# Altium schematic symbol library Semi-ATE.SchLib: 322 symbols (part 5 of 6)
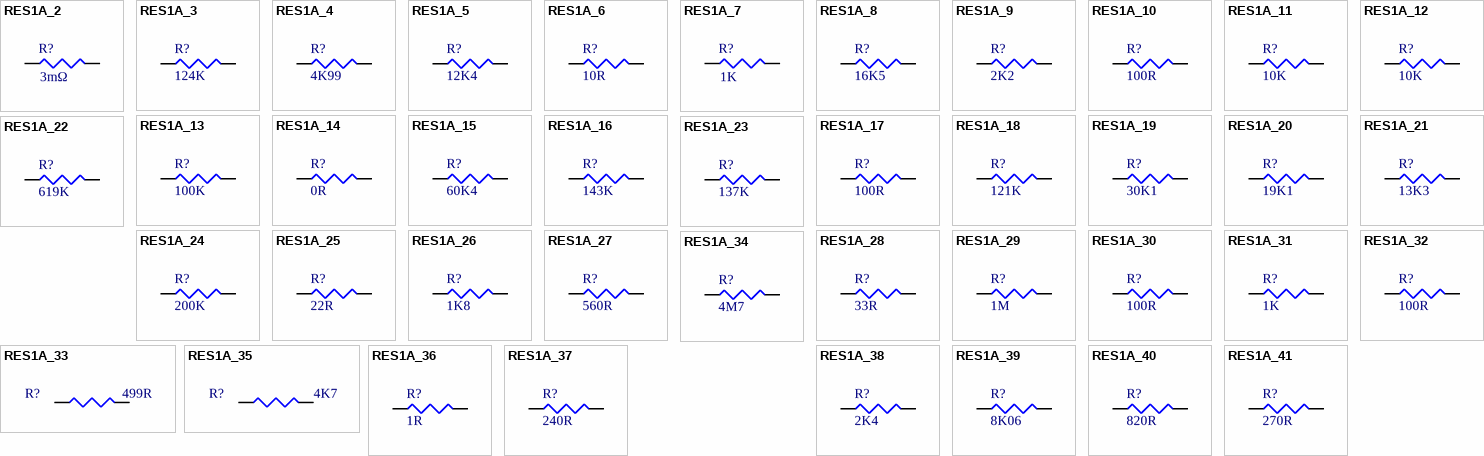
[diagram p23: symbols RES1A_2 to RES1A_41]

## RES1A_6
designator R?, comment value 10R  (hidden comment: R)
RES SMD 10 OHM 1% 1/8W 0805; 04. Manufacturer: Yageo; 07. Manufacturer  Part Number: RC0805FR-0710RL; POPULATED: yes; Parameters: 1/8W, 50V, 1%; 03. Unit Price: 0.09; Voltage Rating: 50V; 3D-Export: No; 01. Distributor: DigiKey; 02. Distributor Part Number: 311-10.0CRDKR-ND; 09. Operating Temperature: -55°C ~ 155°C; 11. RoHS: YES; Temperature Range: -55°C/+125°C; Power Rating: 1/8W; Tolerance: ±1%; Type: Thick Film; ComponentLink4Description: Info; ComponentLink4URL: https://www.digikey.de/product-detail/en/yageo/RC0805FR-0710RL/311-10.0CRDKR-ND/733428; ComponentLink5Description: DataSheet; ComponentLink5URL: http://www.yageo.com/documents/recent/PYu-RC_Group_51_RoHS_L_10.pdf
footprint R0402 (Chip Resistor, Body 1.1x0.5mm (LxW typ), IPC High Density)
footprint R0603 (Chip Resistor, Body 1.6x0.8mm (LxW typ), IPC High Density)
footprint R0805 (Chip Resistor, Body 2.0x1.3mm (LxW typ), IPC High Density)
footprint R1206 (Chip Resistor, Body 3.2x1.6mm (LxW typ), IPC High Density)
footprint R1210 (Chip Resistor, Body 3.2x2.5mm (LxW typ), IPC High Density)
footprint R2010 (Chip Resistor, Body 5.0x2.5mm (LxW typ), IPC High Density)
footprint R2512 (Chip Resistor, Body 6.3x3.2mm (LxW typ), IPC High Density)
footprint R0805 Reflow
pins: 1, 2

## RES1A_7
designator R?, comment value 1K  (hidden comment: R)
RES 1K OHM 1% 1/8W 0805; 04. Manufacturer: Stackpole Electronics Inc; 07. Manufacturer  Part Number: RMCF0805FT1K00; POPULATED: yes; Parameters: 1/8W, 50V, 1%; 03. Unit Price: 0.09; Voltage Rating: 50V; 3D-Export: No; 01. Distributor: DigiKey; 02. Distributor Part Number: RMCF0805FT1K00DKR-ND; 09. Operating Temperature: -55°C ~ 155°C; 11. RoHS: YES; Temperature Range: -55°C/+125°C; Power Rating: 1/8W; Tolerance: ±1%; Type: Thick Film; ComponentLink4Description: Info; ComponentLink4URL: https://www.digikey.de/product-detail/en/stackpole-electronics-inc/RMCF0805FT1K00/RMCF0805FT1K00DKR-ND/1943276; ComponentLink5Description: DataSheet; ComponentLink5URL: https://www.seielect.com/catalog/sei-rmcf_rmcp.pdf
footprint R0402 (Chip Resistor, Body 1.1x0.5mm (LxW typ), IPC High Density)
footprint R0603 (Chip Resistor, Body 1.6x0.8mm (LxW typ), IPC High Density)
footprint R0805 (Chip Resistor, Body 2.0x1.3mm (LxW typ), IPC High Density)
footprint R1206 (Chip Resistor, Body 3.2x1.6mm (LxW typ), IPC High Density)
footprint R1210 (Chip Resistor, Body 3.2x2.5mm (LxW typ), IPC High Density)
footprint R2010 (Chip Resistor, Body 5.0x2.5mm (LxW typ), IPC High Density)
footprint R2512 (Chip Resistor, Body 6.3x3.2mm (LxW typ), IPC High Density)
footprint R0805 Reflow
pins: 1, 2

## RES1A_8
designator R?, comment value 16K5  (hidden comment: R)
RES SMD 16.5K OHM 1% 1/16W 0402; 04. Manufacturer: Yageo; 07. Manufacturer  Part Number: RC0402FR-0716K5L; POPULATED: yes; Parameters: 1/16W, 50V, 1%; 03. Unit Price: 0.09; Voltage Rating: 50V; 3D-Export: No; 01. Distributor: DigiKey; 02. Distributor Part Number: YAG3002DKR-ND; 09. Operating Temperature: -55°C ~ 155°C; 11. RoHS: YES; Temperature Range: -55°C/+125°C; Power Rating: 1/16W; Tolerance: ±1%; Type: Thick Film; ComponentLink4Description: Info; ComponentLink4URL: https://www.digikey.de/product-detail/en/yageo/RC0402FR-0716K5L/YAG3002DKR-ND/5282873
footprint R0402 (Chip Resistor, Body 1.1x0.5mm (LxW typ), IPC High Density)
footprint R0603 (Chip Resistor, Body 1.6x0.8mm (LxW typ), IPC High Density)
footprint R0805 (Chip Resistor, Body 2.0x1.3mm (LxW typ), IPC High Density)
footprint R1206 (Chip Resistor, Body 3.2x1.6mm (LxW typ), IPC High Density)
footprint R1210 (Chip Resistor, Body 3.2x2.5mm (LxW typ), IPC High Density)
footprint R2010 (Chip Resistor, Body 5.0x2.5mm (LxW typ), IPC High Density)
footprint R2512 (Chip Resistor, Body 6.3x3.2mm (LxW typ), IPC High Density)
footprint R0402 Reflow
pins: 1, 2

## RES1A_9
designator R?, comment value 2K2  (hidden comment: R)
RES SMD 2.2K OHM 1% 1/16W 0402; 04. Manufacturer: Yageo; 07. Manufacturer  Part Number: RC0402FR-072K2L; POPULATED: yes; Parameters: 1/16W, 50V, 1%; 03. Unit Price: 0.09; Voltage Rating: 50V; 3D-Export: No; 01. Distributor: DigiKey; 02. Distributor Part Number: 311-2.20KLRDKR-ND; 09. Operating Temperature: -55°C ~ 155°C; 11. RoHS: YES; Temperature Range: -55°C/+125°C; Power Rating: 1/16W; Tolerance: ±1%; Type: Thick Film; ComponentLink4Description: Info; ComponentLink4URL: https://www.digikey.de/product-detail/en/yageo/RC0402FR-072K2L/311-2.20KLRDKR-ND/732447
footprint R0402 (Chip Resistor, Body 1.1x0.5mm (LxW typ), IPC High Density)
footprint R0603 (Chip Resistor, Body 1.6x0.8mm (LxW typ), IPC High Density)
footprint R0805 (Chip Resistor, Body 2.0x1.3mm (LxW typ), IPC High Density)
footprint R1206 (Chip Resistor, Body 3.2x1.6mm (LxW typ), IPC High Density)
footprint R1210 (Chip Resistor, Body 3.2x2.5mm (LxW typ), IPC High Density)
footprint R2010 (Chip Resistor, Body 5.0x2.5mm (LxW typ), IPC High Density)
footprint R2512 (Chip Resistor, Body 6.3x3.2mm (LxW typ), IPC High Density)
footprint R0402 Reflow
pins: 1, 2

## RES1A_10
designator R?, comment value 100R  (hidden comment: R)
RES 100 OHM 1% 1/2W 1206; 04. Manufacturer: Stackpole Electronics Inc; 07. Manufacturer  Part Number: RNCP1206FTD100R; POPULATED: yes; Parameters: 1/4W, 50V, 1%; 03. Unit Price: 0.09; Power Rating: 1/4W; Voltage Rating: 50V; 3D-Export: No; 01. Distributor: DigiKey; 02. Distributor Part Number: RNCP1206FTD100RDKR-ND; 09. Operating Temperature: -55°C ~ 155°C; 11. RoHS: YES; Temperature Range: -55°C/+125°C; Tolerance: ±1%; Type: Thick Film; ComponentLink4Description: Info; ComponentLink4URL: https://www.digikey.de/product-detail/en/stackpole-electronics-inc/RNCP1206FTD100R/RNCP1206FTD100RDKR-ND/2240992; ComponentLink5Description: DataSheet; ComponentLink5URL: https://www.seielect.com/catalog/sei-rncp.pdf
footprint R0402 (Chip Resistor, Body 1.1x0.5mm (LxW typ), IPC High Density)
footprint R0603 (Chip Resistor, Body 1.6x0.8mm (LxW typ), IPC High Density)
footprint R0805 (Chip Resistor, Body 2.0x1.3mm (LxW typ), IPC High Density)
footprint R1206 (Chip Resistor, Body 3.2x1.6mm (LxW typ), IPC High Density)
footprint R1210 (Chip Resistor, Body 3.2x2.5mm (LxW typ), IPC High Density)
footprint R2010 (Chip Resistor, Body 5.0x2.5mm (LxW typ), IPC High Density)
footprint R2512 (Chip Resistor, Body 6.3x3.2mm (LxW typ), IPC High Density)
footprint R1206 Reflow
pins: 1, 2

## RES1A_11
designator R?, comment value 10K  (hidden comment: R)
RES SMD 10K OHM 1% 1/16W 0402; 04. Manufacturer: Yageo; 07. Manufacturer  Part Number: RC0402FR-0710KL; POPULATED: yes; Parameters: 1/16W, 50V, 1%; 03. Unit Price: 0.09; Voltage Rating: 50V; 3D-Export: No; 01. Distributor: DigiKey; 02. Distributor Part Number: 311-10.0KLRDKR-ND; 09. Operating Temperature: -55°C ~ 155°C; 11. RoHS: YES; Temperature Range: -55°C/+125°C; Power Rating: 1/16W; Tolerance: ±1%; Type: Thick Film; ComponentLink4Description: Info; ComponentLink4URL: https://www.digikey.de/product-detail/en/yageo/RC0402FR-0710KL/311-10.0KLRDKR-ND/732417; ComponentLink5Description: DataSheet; ComponentLink5URL: http://www.yageo.com/documents/recent/PYu-RC_Group_51_RoHS_L_10.pdf
footprint R0402 (Chip Resistor, Body 1.1x0.5mm (LxW typ), IPC High Density)
footprint R0603 (Chip Resistor, Body 1.6x0.8mm (LxW typ), IPC High Density)
footprint R0805 (Chip Resistor, Body 2.0x1.3mm (LxW typ), IPC High Density)
footprint R1206 (Chip Resistor, Body 3.2x1.6mm (LxW typ), IPC High Density)
footprint R1210 (Chip Resistor, Body 3.2x2.5mm (LxW typ), IPC High Density)
footprint R2010 (Chip Resistor, Body 5.0x2.5mm (LxW typ), IPC High Density)
footprint R2512 (Chip Resistor, Body 6.3x3.2mm (LxW typ), IPC High Density)
footprint R0402 Reflow
pins: 1, 2

## RES1A_12
designator R?, comment value 10K  (hidden comment: R)
RES SMD 10K OHM 1% 1/10W 0603; 04. Manufacturer: Yageo; 07. Manufacturer  Part Number: RC0603FR-0710KL; POPULATED: yes; Parameters: 1/8W, 50V, 1%; 03. Unit Price: 0.09; Voltage Rating: 50V; 3D-Export: No; 01. Distributor: DigiKey; 02. Distributor Part Number: 311-10.0KHRDKR-ND; 09. Operating Temperature: -55°C ~ 155°C; 11. RoHS: YES; Temperature Range: -55°C/+125°C; Power Rating: 1/10W; Tolerance: ±1%; Type: Thick Film; ComponentLink4Description: Info; ComponentLink4URL: https://www.digikey.de/product-detail/en/yageo/RC0603FR-0710KL/311-10.0KHRDKR-ND/732774; ComponentLink5Description: DataSheet; ComponentLink5URL: http://www.yageo.com/documents/recent/PYu-RC_Group_51_RoHS_L_10.pdf
footprint R0402 (Chip Resistor, Body 1.1x0.5mm (LxW typ), IPC High Density)
footprint R0603 (Chip Resistor, Body 1.6x0.8mm (LxW typ), IPC High Density)
footprint R0805 (Chip Resistor, Body 2.0x1.3mm (LxW typ), IPC High Density)
footprint R1206 (Chip Resistor, Body 3.2x1.6mm (LxW typ), IPC High Density)
footprint R1210 (Chip Resistor, Body 3.2x2.5mm (LxW typ), IPC High Density)
footprint R2010 (Chip Resistor, Body 5.0x2.5mm (LxW typ), IPC High Density)
footprint R2512 (Chip Resistor, Body 6.3x3.2mm (LxW typ), IPC High Density)
footprint R0603 Reflow
pins: 1, 2

## RES1A_13
designator R?, comment value 100K  (hidden comment: R)
RES SMD 100K OHM 1% 1/16W 0402; 04. Manufacturer: Yageo; 07. Manufacturer  Part Number: RC0402FR-07100KL; POPULATED: yes; Parameters: 1/16W, 50V, 1%; 03. Unit Price: 0.09; Voltage Rating: 50V; 3D-Export: No; 01. Distributor: DigiKey; 02. Distributor Part Number: 311-100KLRDKR-ND; 09. Operating Temperature: -55°C ~ 155°C; 11. RoHS: YES; Temperature Range: -55°C/+125°C; Power Rating: 1/16W; Tolerance: ±1%; Type: Thick Film; ComponentLink4Description: Info; ComponentLink4URL: https://www.digikey.de/product-detail/en/yageo/RC0402FR-07100KL/311-100KLRDKR-ND/732420; ComponentLink5Description: DataSheet; ComponentLink5URL: http://www.yageo.com/documents/recent/PYu-RC_Group_51_RoHS_L_10.pdf
footprint R0402 (Chip Resistor, Body 1.1x0.5mm (LxW typ), IPC High Density)
footprint R0603 (Chip Resistor, Body 1.6x0.8mm (LxW typ), IPC High Density)
footprint R0805 (Chip Resistor, Body 2.0x1.3mm (LxW typ), IPC High Density)
footprint R1206 (Chip Resistor, Body 3.2x1.6mm (LxW typ), IPC High Density)
footprint R1210 (Chip Resistor, Body 3.2x2.5mm (LxW typ), IPC High Density)
footprint R2010 (Chip Resistor, Body 5.0x2.5mm (LxW typ), IPC High Density)
footprint R2512 (Chip Resistor, Body 6.3x3.2mm (LxW typ), IPC High Density)
footprint R0402 Reflow
pins: 1, 2

## RES1A_14
designator R?, comment value 0R  (hidden comment: R)
RES SMD 0 OHM JUMPER 1/16W 0402; 04. Manufacturer: Yageo; 07. Manufacturer  Part Number: RC0402JR-070RL; POPULATED: yes; Parameters: 1A; 03. Unit Price: 0.09; Power Rating: N.A.; Tolerance: ±1%; 3D-Export: No; 01. Distributor: DigiKey; 02. Distributor Part Number: 311-0.0JRDKR-ND; 09. Operating Temperature: -55°C ~ 155°C; 11. RoHS: YES; Temperature Range: -55°C/+125°C; Type: Thick Film; Voltage Rating: N.A.; ComponentLink4Description: Info; ComponentLink4URL: https://www.digikey.de/product-detail/en/yageo/RC0402JR-070RL/311-0.0JRDKR-ND/732300; ComponentLink5Description: DataSheet; ComponentLink5URL: http://www.yageo.com/documents/recent/PYu-RC_Group_51_RoHS_L_10.pdf
footprint R0402 (Chip Resistor, Body 1.1x0.5mm (LxW typ), IPC High Density)
footprint R0603 (Chip Resistor, Body 1.6x0.8mm (LxW typ), IPC High Density)
footprint R0805 (Chip Resistor, Body 2.0x1.3mm (LxW typ), IPC High Density)
footprint R1206 (Chip Resistor, Body 3.2x1.6mm (LxW typ), IPC High Density)
footprint R1210 (Chip Resistor, Body 3.2x2.5mm (LxW typ), IPC High Density)
footprint R2010 (Chip Resistor, Body 5.0x2.5mm (LxW typ), IPC High Density)
footprint R2512 (Chip Resistor, Body 6.3x3.2mm (LxW typ), IPC High Density)
footprint R0402 Reflow
pins: 1, 2

## RES1A_15
designator R?, comment value 60K4  (hidden comment: R)
RES SMD 60.4K OHM 1% 1/16W 0402; 04. Manufacturer: Yageo; 07. Manufacturer  Part Number: RC0402FR-0760K4L; POPULATED: yes; Parameters: 1/16W, 50V, 1%; 03. Unit Price: 0.09; Voltage Rating: 50V; 3D-Export: No; Temperature Range: -55°C/+125°C; 01. Distributor: DigiKey; 02. Distributor Part Number: 311-60.4KLRDKR-ND; 09. Operating Temperature: -55°C ~ 155°C; 11. RoHS: YES; Power Rating: 1/16W; Tolerance: ±1%; Type: Thick Film; ComponentLink4Description: Info; ComponentLink4URL: https://www.digikey.de/product-detail/en/yageo/RC0402FR-0760K4L/311-60.4KLRDKR-ND/732537; ComponentLink5Description: DataSheet; ComponentLink5URL: http://www.yageo.com/documents/recent/PYu-RC_Group_51_RoHS_L_10.pdf
footprint R0603 (Chip Resistor, Body 1.6x0.8mm (LxW typ), IPC High Density)
footprint R0402
footprint R0402 Reflow
pins: 1, 2

## RES1A_16
designator R?, comment value 143K  (hidden comment: R)
RES SMD 143K OHM 1% 1/16W 0402; 04. Manufacturer: Yageo; 07. Manufacturer  Part Number: RC0402FR-07143KL; POPULATED: yes; Parameters: 1/16W, 50V, 1%; 03. Unit Price: 0.09; Voltage Rating: 50V; 3D-Export: No; Temperature Range: -55°C/+125°C; 01. Distributor: DigiKey; 02. Distributor Part Number: YAG2979CT-ND; 09. Operating Temperature: -55°C ~ 155°C; 11. RoHS: YES; Power Rating: 1/16W; Tolerance: ±1%; Type: Thick Film; ComponentLink4Description: Info; ComponentLink4URL: https://www.digikey.de/products/en?keywords=YAG2979CT-ND; ComponentLink5Description: DataSheet; ComponentLink5URL: http://www.yageo.com/documents/recent/PYu-RC_Group_51_RoHS_L_10.pdf
footprint R0603 (Chip Resistor, Body 1.6x0.8mm (LxW typ), IPC High Density)
footprint R0402
footprint R0402 Reflow
pins: 1, 2

## RES1A_17
designator R?, comment value 100R  (hidden comment: R)
RES SMD 100 OHM 1% 1/16W 0402; 04. Manufacturer: Yageo; 07. Manufacturer  Part Number: RC0402FR-07100RL; POPULATED: yes; Parameters: 1/16W, 50V, 1%; 03. Unit Price: 0.09; Voltage Rating: 50V; 3D-Export: No; Temperature Range: -55°C/+125°C; 01. Distributor: DigiKey; 02. Distributor Part Number: 311-100LRDKR-ND; 09. Operating Temperature: -55°C ~ 155°C; 11. RoHS: YES; Power Rating: 1/16W; Tolerance: ±1%; Type: Thick Film; ComponentLink4Description: Info; ComponentLink4URL: https://www.digikey.de/product-detail/en/yageo/RC0402FR-07100RL/311-100LRDKR-ND/732421; ComponentLink5Description: DataSheet; ComponentLink5URL: http://www.yageo.com/documents/recent/PYu-RC_Group_51_RoHS_L_10.pdf
footprint R0603 (Chip Resistor, Body 1.6x0.8mm (LxW typ), IPC High Density)
footprint R0402
footprint R1206 (Chip Resistor, Body 3.2x1.6mm (LxW typ), IPC High Density)
footprint R0402 Reflow
pins: 1, 2

## RES1A_18
designator R?, comment value 121K  (hidden comment: R)
RES SMD 10K OHM 1% 1/16W 0402; 04. Manufacturer: Yageo; 07. Manufacturer  Part Number: RC0402FR-07121KL; POPULATED: yes; Parameters: 1/16W, 50V, 1%; 03. Unit Price: 0.09; Voltage Rating: 50V; 3D-Export: No; Temperature Range: -55°C/+125°C; 01. Distributor: DigiKey; 02. Distributor Part Number: 311-121KLRCT-ND; 09. Operating Temperature: -55°C ~ 155°C; 11. RoHS: YES; Power Rating: 1/16W; Tolerance: ±1%; Type: Thick Film; ComponentLink4Description: Info; ComponentLink4URL: https://www.digikey.de/products/en?keywords=311-121KLRCT-ND; ComponentLink5Description: DataSheet; ComponentLink5URL: http://www.yageo.com/documents/recent/PYu-RC_Group_51_RoHS_L_10.pdf
footprint R0402 (Chip Resistor, Body 1.1x0.5mm (LxW typ), IPC High Density)
footprint R0603 (Chip Resistor, Body 1.6x0.8mm (LxW typ), IPC High Density)
footprint R0805 (Chip Resistor, Body 2.0x1.3mm (LxW typ), IPC High Density)
footprint R1206 (Chip Resistor, Body 3.2x1.6mm (LxW typ), IPC High Density)
footprint R1210 (Chip Resistor, Body 3.2x2.5mm (LxW typ), IPC High Density)
footprint R2010 (Chip Resistor, Body 5.0x2.5mm (LxW typ), IPC High Density)
footprint R2512 (Chip Resistor, Body 6.3x3.2mm (LxW typ), IPC High Density)
footprint R0402 Reflow
pins: 1, 2

## RES1A_19
designator R?, comment value 30K1  (hidden comment: R)
RES SMD 30.1K OHM 1% 1/16W 0402; 04. Manufacturer: Yageo; 07. Manufacturer  Part Number: RC0402FR-0730K1L; POPULATED: yes; Parameters: 1/16W, 50V, 1%; 03. Unit Price: 0.09; Voltage Rating: 50V; 3D-Export: No; Temperature Range: -55°C/+125°C; 01. Distributor: DigiKey; 02. Distributor Part Number: 311-30.1KLRCT-ND; 09. Operating Temperature: -55°C ~ 155°C; 11. RoHS: YES; Power Rating: 1/16W; Tolerance: ±1%; Type: Thick Film; ComponentLink4Description: Info; ComponentLink4URL: https://www.digikey.de/products/en?keywords=311-30.1KLRCT-ND; ComponentLink5Description: DataSheet; ComponentLink5URL: http://www.yageo.com/documents/recent/PYu-RC_Group_51_RoHS_L_10.pdf
footprint R0402 (Chip Resistor, Body 1.1x0.5mm (LxW typ), IPC High Density)
footprint R0603 (Chip Resistor, Body 1.6x0.8mm (LxW typ), IPC High Density)
footprint R0805 (Chip Resistor, Body 2.0x1.3mm (LxW typ), IPC High Density)
footprint R1206 (Chip Resistor, Body 3.2x1.6mm (LxW typ), IPC High Density)
footprint R1210 (Chip Resistor, Body 3.2x2.5mm (LxW typ), IPC High Density)
footprint R2010 (Chip Resistor, Body 5.0x2.5mm (LxW typ), IPC High Density)
footprint R2512 (Chip Resistor, Body 6.3x3.2mm (LxW typ), IPC High Density)
footprint R0402 Reflow
pins: 1, 2

## RES1A_20
designator R?, comment value 19K1  (hidden comment: R)
RES SMD 19.1K OHM 1% 1/16W 0402; 04. Manufacturer: Yageo; 07. Manufacturer  Part Number: RC0402FR-0719K1L; POPULATED: yes; Parameters: 1/16W, 50V, 1%; 03. Unit Price: 0.09; Voltage Rating: 50V; 3D-Export: No; Temperature Range: -55°C/+125°C; 01. Distributor: DigiKey; 02. Distributor Part Number: 311-19.1KLRCT-ND; 09. Operating Temperature: -55°C ~ 155°C; 11. RoHS: YES; Power Rating: 1/16W; Tolerance: ±1%; Type: Thick Film; ComponentLink4Description: Info; ComponentLink4URL: https://www.digikey.de/products/en?keywords=311-19.1KLRCT-ND; ComponentLink5Description: DataSheet; ComponentLink5URL: http://www.yageo.com/documents/recent/PYu-RC_Group_51_RoHS_L_10.pdf
footprint R0402 (Chip Resistor, Body 1.1x0.5mm (LxW typ), IPC High Density)
footprint R0603 (Chip Resistor, Body 1.6x0.8mm (LxW typ), IPC High Density)
footprint R0805 (Chip Resistor, Body 2.0x1.3mm (LxW typ), IPC High Density)
footprint R1206 (Chip Resistor, Body 3.2x1.6mm (LxW typ), IPC High Density)
footprint R1210 (Chip Resistor, Body 3.2x2.5mm (LxW typ), IPC High Density)
footprint R2010 (Chip Resistor, Body 5.0x2.5mm (LxW typ), IPC High Density)
footprint R2512 (Chip Resistor, Body 6.3x3.2mm (LxW typ), IPC High Density)
footprint R0402 Reflow
pins: 1, 2

## RES1A_21
designator R?, comment value 13K3  (hidden comment: R)
RES SMD 13.3K OHM 1% 1/16W 0402; 04. Manufacturer: Yageo; 07. Manufacturer  Part Number: RC0402FR-0713K3L; POPULATED: yes; Parameters: 1/16W, 50V, 1%; 03. Unit Price: 0.09; Voltage Rating: 50V; 3D-Export: No; Temperature Range: -55°C/+125°C; 01. Distributor: DigiKey; 02. Distributor Part Number: YAG2974CT-ND; 09. Operating Temperature: -55°C ~ 155°C; 11. RoHS: YES; Power Rating: 1/16W; Tolerance: ±1%; Type: Thick Film; ComponentLink4Description: Info; ComponentLink4URL: https://www.digikey.de/products/en?keywords=YAG2974CT-ND; ComponentLink5Description: DataSheet; ComponentLink5URL: http://www.yageo.com/documents/recent/PYu-RC_Group_51_RoHS_L_10.pdf
footprint R0402 (Chip Resistor, Body 1.1x0.5mm (LxW typ), IPC High Density)
footprint R0603 (Chip Resistor, Body 1.6x0.8mm (LxW typ), IPC High Density)
footprint R0805 (Chip Resistor, Body 2.0x1.3mm (LxW typ), IPC High Density)
footprint R1206 (Chip Resistor, Body 3.2x1.6mm (LxW typ), IPC High Density)
footprint R1210 (Chip Resistor, Body 3.2x2.5mm (LxW typ), IPC High Density)
footprint R2010 (Chip Resistor, Body 5.0x2.5mm (LxW typ), IPC High Density)
footprint R2512 (Chip Resistor, Body 6.3x3.2mm (LxW typ), IPC High Density)
footprint R0402 Reflow
pins: 1, 2

## RES1A_22
designator R?, comment value 619K  (hidden comment: R)
RES SMD 619K OHM 1% 1/16W 0402; 04. Manufacturer: Yageo; 07. Manufacturer  Part Number: AC0402FR-07619KL; Parameters: 1/16W, 50V, 1%; POPULATED: yes; 03. Unit Price: 0.09; Voltage Rating: 50V; 3D-Export: No; 01. Distributor: DigiKey; 02. Distributor Part Number: YAG5679DKR-ND; 09. Operating Temperature: -55°C ~ 155°C; 11. RoHS: YES; Temperature Range: -55°C/+125°C; Power Rating: 1/16W; Tolerance: ±1%; Type: Thick Film; ComponentLink4Description: Info; ComponentLink4URL: https://www.digikey.de/product-detail/en/yageo/RC0402FR-07453KL/YAG3164DKR-ND/5283035; ComponentLink5Description: DataSheet; ComponentLink5URL: http://www.yageo.com/documents/recent/PYu-RC_Group_51_RoHS_L_10.pdf
footprint R0603 (Chip Resistor, Body 1.6x0.8mm (LxW typ), IPC High Density)
footprint R0402
footprint R0402 Reflow
pins: 1, 2

## RES1A_23
designator R?, comment value 137K  (hidden comment: R)
RES SMD 137K OHM 1% 1/16W 0402; 04. Manufacturer: Yageo; 07. Manufacturer  Part Number: RC0402FR-07137KL; Parameters: 1/16W, 50V, 1%; POPULATED: yes; 03. Unit Price: 0.09; Voltage Rating: 50V; 3D-Export: No; 01. Distributor: DigiKey; 02. Distributor Part Number: YAG2972DKR-ND; 09. Operating Temperature: -55°C ~ 155°C; 11. RoHS: YES; Temperature Range: -55°C/+125°C; Power Rating: 1/16W; Tolerance: ±1%; Type: Thick Film; ComponentLink4Description: Info; ComponentLink4URL: https://www.digikey.de/product-detail/en/yageo/RC0402FR-07100KL/311-100KLRDKR-ND/732420; ComponentLink5Description: DataSheet; ComponentLink5URL: http://www.yageo.com/documents/recent/PYu-RC_Group_51_RoHS_L_10.pdf
footprint R0603 (Chip Resistor, Body 1.6x0.8mm (LxW typ), IPC High Density)
footprint R0402
footprint R0402 Reflow
pins: 1, 2

## RES1A_24
designator R?, comment value 200K  (hidden comment: R)
RES SMD 200K OHM 1% 1/16W 0402; 04. Manufacturer: Yageo; 07. Manufacturer  Part Number: RC0402FR-07200KL; POPULATED: yes; Parameters: 1/16W, 50V, 1%; 03. Unit Price: 0.09; Voltage Rating: 50V; 3D-Export: No; 01. Distributor: DigiKey; 02. Distributor Part Number: 311-200KLRDKR-ND; 09. Operating Temperature: -55°C ~ 155°C; 11. RoHS: YES; Temperature Range: -55°C/+125°C; Power Rating: 1/16W; Tolerance: ±1%; Type: Thick Film; ComponentLink4Description: Info; ComponentLink4URL: https://www.digikey.de/product-detail/en/yageo/RC0402FR-07200KL/311-200KLRDKR-ND/732452
footprint R0402 (Chip Resistor, Body 1.1x0.5mm (LxW typ), IPC High Density)
footprint R0603 (Chip Resistor, Body 1.6x0.8mm (LxW typ), IPC High Density)
footprint R0805 (Chip Resistor, Body 2.0x1.3mm (LxW typ), IPC High Density)
footprint R1206 (Chip Resistor, Body 3.2x1.6mm (LxW typ), IPC High Density)
footprint R1210 (Chip Resistor, Body 3.2x2.5mm (LxW typ), IPC High Density)
footprint R2010 (Chip Resistor, Body 5.0x2.5mm (LxW typ), IPC High Density)
footprint R2512 (Chip Resistor, Body 6.3x3.2mm (LxW typ), IPC High Density)
footprint R0402 Reflow
pins: 1, 2

## RES1A_25
designator R?, comment value 22R  (hidden comment: R)
RES SMD 22 OHM 1% 1/16W 0402; 04. Manufacturer: Yageo; 07. Manufacturer  Part Number: RC0402FR-0722RL; POPULATED: yes; Parameters: 1/16W, 50V, 1%; 03. Unit Price: 0.09; Voltage Rating: 50V; 3D-Export: No; Temperature Range: -55°C/+125°C; 01. Distributor: DigiKey; 02. Distributor Part Number: 311-22.0LRDKR-ND; 09. Operating Temperature: -55°C ~ 155°C; 11. RoHS: YES; Power Rating: 1/16W; Tolerance: ±1%; Type: Thick Film; ComponentLink4Description: Info; ComponentLink4URL: https://www.digikey.de/product-detail/en/yageo/RC0402FR-0722RL/311-22.0LRDKR-ND/732456; ComponentLink5Description: DataSheet; ComponentLink5URL: http://www.yageo.com/documents/recent/PYu-RC_Group_51_RoHS_L_10.pdf
footprint R0402 (Chip Resistor, Body 1.1x0.5mm (LxW typ), IPC High Density)
footprint R0603 (Chip Resistor, Body 1.6x0.8mm (LxW typ), IPC High Density)
footprint R0805 (Chip Resistor, Body 2.0x1.3mm (LxW typ), IPC High Density)
footprint R1206 (Chip Resistor, Body 3.2x1.6mm (LxW typ), IPC High Density)
footprint R1210 (Chip Resistor, Body 3.2x2.5mm (LxW typ), IPC High Density)
footprint R2010 (Chip Resistor, Body 5.0x2.5mm (LxW typ), IPC High Density)
footprint R2512 (Chip Resistor, Body 6.3x3.2mm (LxW typ), IPC High Density)
footprint R0402 Reflow
pins: 1, 2

## RES1A_26
designator R?, comment value 1K8  (hidden comment: R)
RES SMD 1.8K OHM 1% 1/16W 0402; 04. Manufacturer: Yageo; 07. Manufacturer  Part Number: RC0402FR-071K8L; Parameters: 1/16W, 50V, 1%; POPULATED: yes; 03. Unit Price: 0.09; Voltage Rating: 50V; 3D-Export: No; Temperature Range: -55°C/+125°C; 01. Distributor: DigiKey; 02. Distributor Part Number: 311-1.80KLRDKR-ND; 09. Operating Temperature: -55°C ~ 155°C; 11. RoHS: YES; Power Rating: 1/16W; Tolerance: ±1%; Type: Thick Film; ComponentLink4Description: Info; ComponentLink4URL: https://www.digikey.de/product-detail/en/yageo/RC0402FR-071K8L/311-1.80KLRDKR-ND/732414; ComponentLink5Description: DataSheet; ComponentLink5URL: http://www.yageo.com/documents/recent/PYu-RC_Group_51_RoHS_L_10.pdf
footprint R0402 (Chip Resistor, Body 1.1x0.5mm (LxW typ), IPC High Density)
footprint R0603 (Chip Resistor, Body 1.6x0.8mm (LxW typ), IPC High Density)
footprint R0805 (Chip Resistor, Body 2.0x1.3mm (LxW typ), IPC High Density)
footprint R1206 (Chip Resistor, Body 3.2x1.6mm (LxW typ), IPC High Density)
footprint R1210 (Chip Resistor, Body 3.2x2.5mm (LxW typ), IPC High Density)
footprint R2010 (Chip Resistor, Body 5.0x2.5mm (LxW typ), IPC High Density)
footprint R2512 (Chip Resistor, Body 6.3x3.2mm (LxW typ), IPC High Density)
footprint R0402 Reflow
pins: 1, 2

## RES1A_27
designator R?, comment value 560R  (hidden comment: R)
RES SMD 560 OHM 1% 1/16W 0402; 04. Manufacturer: Yageo; 07. Manufacturer  Part Number: RC0402FR-07560RL; POPULATED: yes; Parameters: 1/16W, 50V, 1%; 03. Unit Price: 0.09; Voltage Rating: 50V; 3D-Export: No; Temperature Range: -55°C/+125°C; 01. Distributor: DigiKey; 02. Distributor Part Number: 311-560LRDKR-ND; 09. Operating Temperature: -55°C ~ 155°C; 11. RoHS: YES; Power Rating: 1/16W; Tolerance: ±1%; Type: Thick Film; ComponentLink4Description: Info; ComponentLink4URL: https://www.digikey.de/product-detail/en/yageo/RC0402FR-07560RL/311-560LRDKR-ND/732532; ComponentLink5Description: DataSheet; ComponentLink5URL: http://www.yageo.com/documents/recent/PYu-RC_Group_51_RoHS_L_10.pdf
footprint R0402 (Chip Resistor, Body 1.1x0.5mm (LxW typ), IPC High Density)
footprint R0603 (Chip Resistor, Body 1.6x0.8mm (LxW typ), IPC High Density)
footprint R0805 (Chip Resistor, Body 2.0x1.3mm (LxW typ), IPC High Density)
footprint R1206 (Chip Resistor, Body 3.2x1.6mm (LxW typ), IPC High Density)
footprint R1210 (Chip Resistor, Body 3.2x2.5mm (LxW typ), IPC High Density)
footprint R2010 (Chip Resistor, Body 5.0x2.5mm (LxW typ), IPC High Density)
footprint R2512 (Chip Resistor, Body 6.3x3.2mm (LxW typ), IPC High Density)
footprint R0402 Reflow
pins: 1, 2

## RES1A_28
designator R?, comment value 33R  (hidden comment: R)
RES SMD 33 OHM 1% 1/16W 0402; 04. Manufacturer: Yageo; 07. Manufacturer  Part Number: RC0402FR-0733RL; POPULATED: yes; Parameters: 1/16W, 50V, 1%; 03. Unit Price: 0.09; Voltage Rating: 50V; 3D-Export: No; Temperature Range: -55°C/+125°C; 01. Distributor: DigiKey; 02. Distributor Part Number: 311-33.0LRDKR-ND; 09. Operating Temperature: -55°C ~ 155°C; 11. RoHS: YES; Power Rating: 1/16W; Tolerance: ±1%; Type: Thick Film; ComponentLink4Description: Info; ComponentLink4URL: https://www.digikey.de/product-detail/en/yageo/RC0402FR-0733RL/311-33.0LRDKR-ND/732487; ComponentLink5Description: DataSheet; ComponentLink5URL: http://www.yageo.com/documents/recent/PYu-RC_Group_51_RoHS_L_10.pdf
footprint R0402 (Chip Resistor, Body 1.1x0.5mm (LxW typ), IPC High Density)
footprint R0402 (Chip Resistor, Body 1.1x0.5mm (LxW typ), IPC High Density)
footprint R0805 (Chip Resistor, Body 2.0x1.3mm (LxW typ), IPC High Density)
footprint R1206 (Chip Resistor, Body 3.2x1.6mm (LxW typ), IPC High Density)
footprint R1210 (Chip Resistor, Body 3.2x2.5mm (LxW typ), IPC High Density)
footprint R2010 (Chip Resistor, Body 5.0x2.5mm (LxW typ), IPC High Density)
footprint R2512 (Chip Resistor, Body 6.3x3.2mm (LxW typ), IPC High Density)
footprint R0402 Reflow
pins: 1, 2

## RES1A_29
designator R?, comment value 1M  (hidden comment: R)
RES SMD 1M OHM 1% 1/10W 0402; 04. Manufacturer: Panasonic Electronic Components; 07. Manufacturer  Part Number: ERJ-2RKF1004X; Parameters: 1/10W, 50V, 1%; POPULATED: yes; 03. Unit Price: 0.09; Voltage Rating: 50V; 3D-Export: No; Temperature Range: -55°C/+125°C; 01. Distributor: DigiKey; 02. Distributor Part Number: P1.00MLDKR-ND; 09. Operating Temperature: -55°C ~ 155°C; 11. RoHS: YES; Power Rating: 1/10W; Tolerance: ±1%; Type: Thick Film; ComponentLink4Description: Info; ComponentLink4URL: https://www.digikey.de/product-detail/en/panasonic-electronic-components/ERJ-2RKF1004X/P1.00MLDKR-ND/575436; ComponentLink5Description: DataSheet; ComponentLink5URL: https://industrial.panasonic.com/cdbs/www-data/pdf/RDA0000/AOA0000C304.pdf
footprint 0402
footprint R0402
footprint R0603
footprint R0402 Reflow
pins: 1, 2

## RES1A_30
designator R?, comment value 100R  (hidden comment: R)
RES SMD 100 OHM 1% 1/16W 0603; 04. Manufacturer: TE Connectivity Passive Product; 07. Manufacturer  Part Number: CPF0603F100RC1; POPULATED: yes; Parameters: 1/16W, 50V, 1%; 03. Unit Price: 0.14; Voltage Rating: 50V; 3D-Export: No; Temperature Range: -55°C/+125°C; 01. Distributor: DigiKey; 02. Distributor Part Number: A102200DKR-ND; 09. Operating Temperature: -55°C ~ 155°C; 11. RoHS: YES; Power Rating: 1/16W; Tolerance: ±1%; Type: Thick Film; ComponentLink4Description: Info; ComponentLink4URL: https://www.digikey.de/products/en/resistors/chip-resistor-surface-mount/52?k=&pkeyword=&sv=0&pv7=243&sf=1&FV=c0001%2C400005%2C1f140000%2Cmu100+Ohms%7C2085%2Cffe00034%2C80001&quantity=&ColumnSort=0&page=1&pageSize=25; ComponentLink5Description: DataSheet; ComponentLink5URL: https://www.te.com/commerce/DocumentDelivery/DDEController?Action=srchrtrv&DocNm=1773200&DocType=DS&DocLang=English
footprint R0402 (Chip Resistor, Body 1.1x0.5mm (LxW typ), IPC High Density)
footprint R0603 (Chip Resistor, Body 1.6x0.8mm (LxW typ), IPC High Density)
footprint R0805 (Chip Resistor, Body 2.0x1.3mm (LxW typ), IPC High Density)
footprint R1206 (Chip Resistor, Body 3.2x1.6mm (LxW typ), IPC High Density)
footprint R1210 (Chip Resistor, Body 3.2x2.5mm (LxW typ), IPC High Density)
footprint R2010 (Chip Resistor, Body 5.0x2.5mm (LxW typ), IPC High Density)
footprint R2512 (Chip Resistor, Body 6.3x3.2mm (LxW typ), IPC High Density)
footprint R0603 Reflow
pins: 1, 2

## RES1A_31
designator R?, comment 1K
RES SMD 1K OHM 1% 1/16W 0402; 04. Manufacturer: Yageo; 07. Manufacturer  Part Number: RC0402FR-071KL; Parameters: 1/16W, 50V, 1%; POPULATED: yes; 03. Unit Price: 0.09; Voltage Rating: 50V; 3D-Export: No; Temperature Range: -55°C/+125°C; 01. Distributor: DigiKey; 02. Distributor Part Number: 311-1.00KLRDKR-ND; 09. Operating Temperature: -55°C ~ 155°C; 11. RoHS: YES; Power Rating: 1/16W; Tolerance: ±1%; Type: Thick Film; Value: 1K; ComponentLink4Description: Info; ComponentLink4URL: https://www.digikey.de/product-detail/en/yageo/RC0402FR-071KL/311-1.00KLRDKR-ND/732407; ComponentLink5Description: DataSheet; ComponentLink5URL: http://www.yageo.com/documents/recent/PYu-RC_Group_51_RoHS_L_10.pdf
footprint R0402 (Chip Resistor, Body 1.1x0.5mm (LxW typ), IPC High Density)
footprint R0603 (Chip Resistor, Body 1.6x0.8mm (LxW typ), IPC High Density)
footprint R0805 (Chip Resistor, Body 2.0x1.3mm (LxW typ), IPC High Density)
footprint R1206 (Chip Resistor, Body 3.2x1.6mm (LxW typ), IPC High Density)
footprint R1210 (Chip Resistor, Body 3.2x2.5mm (LxW typ), IPC High Density)
footprint R2010 (Chip Resistor, Body 5.0x2.5mm (LxW typ), IPC High Density)
footprint R2512 (Chip Resistor, Body 6.3x3.2mm (LxW typ), IPC High Density)
footprint R0402 Reflow
pins: 1, 2

## RES1A_32
designator R?, comment value 100R  (hidden comment: R)
RES SMD 100 OHM 1/8W 0805; 04. Manufacturer: Yageo; 07. Manufacturer  Part Number: RC0805FR-07100RL; POPULATED: yes; Parameters: 1A; 03. Unit Price: 0.09; Power Rating: N.A.; Tolerance: ±1%; 3D-Export: No; 01. Distributor: DigiKey; 02. Distributor Part Number: 311-100CRCT-ND; 09. Operating Temperature: -55°C ~ 155°C; 11. RoHS: YES; Temperature Range: -55°C/+125°C; Type: Thick Film; Voltage Rating: N.A.; ComponentLink4Description: Info; ComponentLink4URL: https://www.digikey.de/product-detail/en/yageo/RC0805JR-070RL/311-0.0ARDKR-ND/734110; ComponentLink5Description: DataSheet; ComponentLink5URL: http://www.yageo.com/documents/recent/PYu-RC_Group_51_RoHS_L_10.pdf
footprint R0603 (Chip Resistor, Body 1.6x0.8mm (LxW typ), IPC High Density)
footprint R0805 (Chip Resistor, Body 2.0x1.3mm (LxW typ), IPC High Density)
footprint R0402
footprint R0805 Reflow
pins: 1, 2

## RES1A_33
designator R?, comment value 499R  (hidden comment: R)
RES SMD 499 OHM 1% 1/16W 0402; 04. Manufacturer: Yageo; 07. Manufacturer  Part Number: MCS0402PD4990DE500; POPULATED: yes; Parameters: 1/16W, 25V, 0.5%; 03. Unit Price: 0.09; Power Rating: 1/5W; Tolerance: ±0.5%; Voltage Rating: 50V; 3D-Export: No; 01. Distributor: DigiKey; 02. Distributor Part Number: 749-1510-1-ND; 09. Operating Temperature: -55°C ~ 155°C; 11. RoHS: YES; Temperature Range: -55°C/+125°C; Type: Thick Film; ComponentLink4Description: Info; ComponentLink4URL: https://www.digikey.de/product-detail/en/yageo/RC0402FR-07499RL/311-499LRDKR-ND/732517; ComponentLink5Description: DataSheet; ComponentLink5URL: http://www.yageo.com/documents/recent/PYu-RC_Group_51_RoHS_L_10.pdf
footprint R0402 (Chip Resistor, Body 1.1x0.5mm (LxW typ), IPC High Density)
footprint R0603 (Chip Resistor, Body 1.6x0.8mm (LxW typ), IPC High Density)
footprint R0805 (Chip Resistor, Body 2.0x1.3mm (LxW typ), IPC High Density)
footprint R1206 (Chip Resistor, Body 3.2x1.6mm (LxW typ), IPC High Density)
footprint R1210 (Chip Resistor, Body 3.2x2.5mm (LxW typ), IPC High Density)
footprint R2010 (Chip Resistor, Body 5.0x2.5mm (LxW typ), IPC High Density)
footprint R2512 (Chip Resistor, Body 6.3x3.2mm (LxW typ), IPC High Density)
footprint R0402 Reflow
pins: 1, 2

## RES1A_34
designator R?, comment value 4M7  (hidden comment: R)
RES SMD 4.7M OHM 1% 1/10W 0402; 04. Manufacturer: Stackpole Electronics Inc; 07. Manufacturer  Part Number: RMCF0402FT4M70; Parameters: 1/16W, 50V, 1%; POPULATED: yes; 03. Unit Price: 0.09; Power Rating: 1/16W; Voltage Rating: 50V; 3D-Export: No; Temperature Range: -55°C/+125°C; 01. Distributor: DigiKey; 02. Distributor Part Number: RMCF0402FT4M70DKR-ND; 09. Operating Temperature: -55°C ~ 155°C; 11. RoHS: YES; Tolerance: ±1%; Type: Thick Film; ComponentLink4Description: Info; ComponentLink4URL: https://www.digikey.de/product-detail/en/stackpole-electronics-inc/RMCF0402FT4M70/RMCF0402FT4M70DKR-ND/7791211
footprint 0402
footprint R0402
footprint R0603
footprint R0402 Reflow
pins: 1, 2

## RES1A_35
designator R?, comment 4K7
RES SMD 4.7K OHM 1% 1/16W 0402; 04. Manufacturer: Yageo; 07. Manufacturer  Part Number: RC0402FR-074K7L; Parameters: 1/16W, 50V, 1%; POPULATED: yes; 03. Unit Price: 0.09; Voltage Rating: 50V; 3D-Export: No; Temperature Range: -55°C/+125°C; 01. Distributor: DigiKey; 02. Distributor Part Number: 311-4.7KLRDKR-ND; 09. Operating Temperature: -55°C ~ 155°C; 11. RoHS: YES; Power Rating: 1/16W; Tolerance: ±1%; Type: Thick Film; Value: 4K7; ComponentLink4Description: Info; ComponentLink4URL: https://www.digikey.de/product-detail/en/yageo/RC0402FR-074K7L/311-4.7KLRDKR-ND/2828199; ComponentLink5Description: DataSheet; ComponentLink5URL: http://www.yageo.com/documents/recent/PYu-RC_Group_51_RoHS_L_10.pdf
footprint 0402
footprint R0402
footprint R0603
footprint R0402 Reflow
pins: 1, 2

## RES1A_36
designator R?, comment value 1R  (hidden comment: R)
RES SMD 1 OHM 1% 1/8W 0805; 04. Manufacturer: Yageo; 07. Manufacturer  Part Number: RC0805FR-071RL; POPULATED: yes; Parameters: 1/8W, 50V, 1%; 03. Unit Price: 0.09; Voltage Rating: 50V; 3D-Export: No; Temperature Range: -55°C/+125°C; 01. Distributor: DigiKey; 02. Distributor Part Number: 311-1.00CRCT-ND; 09. Operating Temperature: -55°C ~ 155°C; 11. RoHS: YES; Power Rating: 1/8W; Tolerance: ±1%; Type: Thick Film; ComponentLink4Description: Info; ComponentLink4URL: https://www.digikey.de/products/en?keywords=311-1.00CRCT-ND; ComponentLink5Description: DataSheet; ComponentLink5URL: http://www.yageo.com/documents/recent/PYu-RC_Group_51_RoHS_L_10.pdf
footprint R0402 (Chip Resistor, Body 1.1x0.5mm (LxW typ), IPC High Density)
footprint R0603 (Chip Resistor, Body 1.6x0.8mm (LxW typ), IPC High Density)
footprint R0805 (Chip Resistor, Body 2.0x1.3mm (LxW typ), IPC High Density)
footprint R1206 (Chip Resistor, Body 3.2x1.6mm (LxW typ), IPC High Density)
footprint R1210 (Chip Resistor, Body 3.2x2.5mm (LxW typ), IPC High Density)
footprint R2010 (Chip Resistor, Body 5.0x2.5mm (LxW typ), IPC High Density)
footprint R2512 (Chip Resistor, Body 6.3x3.2mm (LxW typ), IPC High Density)
footprint R0805 Reflow
pins: 1, 2

## RES1A_37
designator R?, comment value 240R  (hidden comment: R)
RES SMD 240 OHM 1% 1/16W 0402; 04. Manufacturer: Yageo; 07. Manufacturer  Part Number: RC0402FR-07240RL; POPULATED: yes; Parameters: 1/16W, 50V, 1%; 03. Unit Price: 0.09; Voltage Rating: 50V; 3D-Export: No; 01. Distributor: DigiKey; 02. Distributor Part Number: 311-240LRDKR-ND; 09. Operating Temperature: -55°C ~ 155°C; 11. RoHS: YES; Temperature Range: -55°C/+125°C; Power Rating: 1/16W; Tolerance: ±1%; Type: Thick Film; ComponentLink4Description: Info; ComponentLink4URL: https://www.digikey.de/product-detail/en/yageo/RC0402FR-07240RL/311-240LRDKR-ND/2828200; ComponentLink5Description: DataSheet; ComponentLink5URL: http://www.yageo.com/documents/recent/PYu-RC_Group_51_RoHS_L_10.pdf
footprint R0402 (Chip Resistor, Body 1.1x0.5mm (LxW typ), IPC High Density)
footprint R0603 (Chip Resistor, Body 1.6x0.8mm (LxW typ), IPC High Density)
footprint R0805 (Chip Resistor, Body 2.0x1.3mm (LxW typ), IPC High Density)
footprint R1206 (Chip Resistor, Body 3.2x1.6mm (LxW typ), IPC High Density)
footprint R1210 (Chip Resistor, Body 3.2x2.5mm (LxW typ), IPC High Density)
footprint R2010 (Chip Resistor, Body 5.0x2.5mm (LxW typ), IPC High Density)
footprint R2512 (Chip Resistor, Body 6.3x3.2mm (LxW typ), IPC High Density)
footprint R0402 Reflow
pins: 1, 2

## RES1A_38
designator R?, comment value 2K4  (hidden comment: R)
RES SMD 2.4K OHM 1% 1/16W 0402; 04. Manufacturer: Yageo; 07. Manufacturer  Part Number: RC0402FR-072K4L; POPULATED: yes; Parameters: 1/16W, 50V, 1%; 03. Unit Price: 0.09; Voltage Rating: 50V; 3D-Export: No; Temperature Range: -55°C/+125°C; 01. Distributor: DigiKey; 02. Distributor Part Number: 311-2.40KLRDKR-ND; 09. Operating Temperature: -55°C ~ 155°C; 11. RoHS: YES; Power Rating: 1/16W; Tolerance: ±1%; Type: Thick Film; ComponentLink4Description: Info; ComponentLink4URL: https://www.digikey.de/product-detail/en/yageo/RC0402FR-072K4L/311-2.40KLRDKR-ND/732449; ComponentLink5Description: DataSheet; ComponentLink5URL: http://www.yageo.com/documents/recent/PYu-RC_Group_51_RoHS_L_10.pdf
footprint R0402 (Chip Resistor, Body 1.1x0.5mm (LxW typ), IPC High Density)
footprint R0603 (Chip Resistor, Body 1.6x0.8mm (LxW typ), IPC High Density)
footprint R0805 (Chip Resistor, Body 2.0x1.3mm (LxW typ), IPC High Density)
footprint R1206 (Chip Resistor, Body 3.2x1.6mm (LxW typ), IPC High Density)
footprint R1210 (Chip Resistor, Body 3.2x2.5mm (LxW typ), IPC High Density)
footprint R2010 (Chip Resistor, Body 5.0x2.5mm (LxW typ), IPC High Density)
footprint R2512 (Chip Resistor, Body 6.3x3.2mm (LxW typ), IPC High Density)
footprint R0402 Reflow
pins: 1, 2

## RES1A_39
designator R?, comment value 8K06  (hidden comment: R)
RES SMD 8.06K OHM 1% 1/16W 0402; 04. Manufacturer: Yageo; 07. Manufacturer  Part Number: RC0402FR-078K06L; POPULATED: yes; 03. Unit Price: 0.09; Voltage Rating: N.A.; 3D-Export: No; 01. Distributor: DigiKey; 02. Distributor Part Number: 311-8.06KLRDKR-ND; 09. Operating Temperature: -55°C ~ 155°C; 11. RoHS: YES; Temperature Range: -55°C/+125°C; Power Rating: 1/16W; Tolerance: ±1%; Type: Thick Film; ComponentLink4Description: Info; ComponentLink4URL: https://www.digikey.de/product-detail/en/yageo/RC0402FR-078K06L/311-8.06KLRDKR-ND/732555; ComponentLink5Description: DataSheet; ComponentLink5URL: http://www.yageo.com/documents/recent/PYu-RC_Group_51_RoHS_L_10.pdf
footprint R0402 (Chip Resistor, Body 1.1x0.5mm (LxW typ), IPC High Density)
footprint R0603 (Chip Resistor, Body 1.6x0.8mm (LxW typ), IPC High Density)
footprint R0805 (Chip Resistor, Body 2.0x1.3mm (LxW typ), IPC High Density)
footprint R1206 (Chip Resistor, Body 3.2x1.6mm (LxW typ), IPC High Density)
footprint R1210 (Chip Resistor, Body 3.2x2.5mm (LxW typ), IPC High Density)
footprint R2010 (Chip Resistor, Body 5.0x2.5mm (LxW typ), IPC High Density)
footprint R2512 (Chip Resistor, Body 6.3x3.2mm (LxW typ), IPC High Density)
footprint R0402 Reflow
pins: 1, 2

## RES1A_40
designator R?, comment value 820R  (hidden comment: R)
RES SMD 820 OHM 1% 1/16W 0402; 04. Manufacturer: Yageo; 07. Manufacturer  Part Number: RC0402FR-07820RL; POPULATED: yes; Parameters: 1/16W, 50V, 1%; 03. Unit Price: 0.09; Voltage Rating: 50V; 3D-Export: No; 01. Distributor: DigiKey; 02. Distributor Part Number: 311-820LRDKR-ND; 09. Operating Temperature: -55°C ~ 155°C; 11. RoHS: YES; Temperature Range: -55°C/+125°C; Power Rating: 1/16W; Tolerance: ±1%; Type: Thick Film; ComponentLink4Description: Info; ComponentLink4URL: https://www.digikey.de/product-detail/en/yageo/RC0402FR-07820RL/311-820LRDKR-ND/2828265; ComponentLink5Description: DataSheet; ComponentLink5URL: http://www.yageo.com/documents/recent/PYu-RC_Group_51_RoHS_L_10.pdf
footprint R0402 (Chip Resistor, Body 1.1x0.5mm (LxW typ), IPC High Density)
footprint R0603 (Chip Resistor, Body 1.6x0.8mm (LxW typ), IPC High Density)
footprint R0805 (Chip Resistor, Body 2.0x1.3mm (LxW typ), IPC High Density)
footprint R1206 (Chip Resistor, Body 3.2x1.6mm (LxW typ), IPC High Density)
footprint R1210 (Chip Resistor, Body 3.2x2.5mm (LxW typ), IPC High Density)
footprint R2010 (Chip Resistor, Body 5.0x2.5mm (LxW typ), IPC High Density)
footprint R2512 (Chip Resistor, Body 6.3x3.2mm (LxW typ), IPC High Density)
footprint R0402 Reflow
pins: 1, 2

## RES1A_41
designator R?, comment value 270R  (hidden comment: R)
RES SMD 270 OHM 1% 1/10W 0603; 04. Manufacturer: Yageo; 07. Manufacturer  Part Number: RC0603FR-07270RL; POPULATED: yes; Parameters: 1/10W, 50V, 1%; 03. Unit Price: 0.09; Voltage Rating: 50V; 3D-Export: No; 01. Distributor: DigiKey; 02. Distributor Part Number: 311-270HRDKR-ND; 09. Operating Temperature: -55°C ~ 155°C; 11. RoHS: YES; Temperature Range: -55°C/+125°C; Power Rating: 1/10W; Tolerance: ±1%; Type: Thick Film; ComponentLink4Description: Info; ComponentLink4URL: https://www.digikey.de/product-detail/en/yageo/RC0603FR-07270RL/311-270HRDKR-ND/732997; ComponentLink5Description: DataSheet; ComponentLink5URL: http://www.yageo.com/documents/recent/PYu-RC_Group_51_RoHS_L_10.pdf
footprint R0402 (Chip Resistor, Body 1.1x0.5mm (LxW typ), IPC High Density)
footprint R0603 (Chip Resistor, Body 1.6x0.8mm (LxW typ), IPC High Density)
footprint R0805 (Chip Resistor, Body 2.0x1.3mm (LxW typ), IPC High Density)
footprint R1206 (Chip Resistor, Body 3.2x1.6mm (LxW typ), IPC High Density)
footprint R1210 (Chip Resistor, Body 3.2x2.5mm (LxW typ), IPC High Density)
footprint R2010 (Chip Resistor, Body 5.0x2.5mm (LxW typ), IPC High Density)
footprint R2512 (Chip Resistor, Body 6.3x3.2mm (LxW typ), IPC High Density)
footprint R0603 Reflow
pins: 1, 2
